# Altium footprint library WR-TBL_Spring Clamp.PcbLib: 258 footprints (part 12 of 17)
Each footprint in its own frame and in the unit in brackets; x right, y up, seen from the top. Pads: shape width x height; smd on the part's side, far side on the other; paste and mask are expansions set on the pad; w line width, h text height; cw(c..) or ccw(c..) is an arc to the next point about the centre after c.
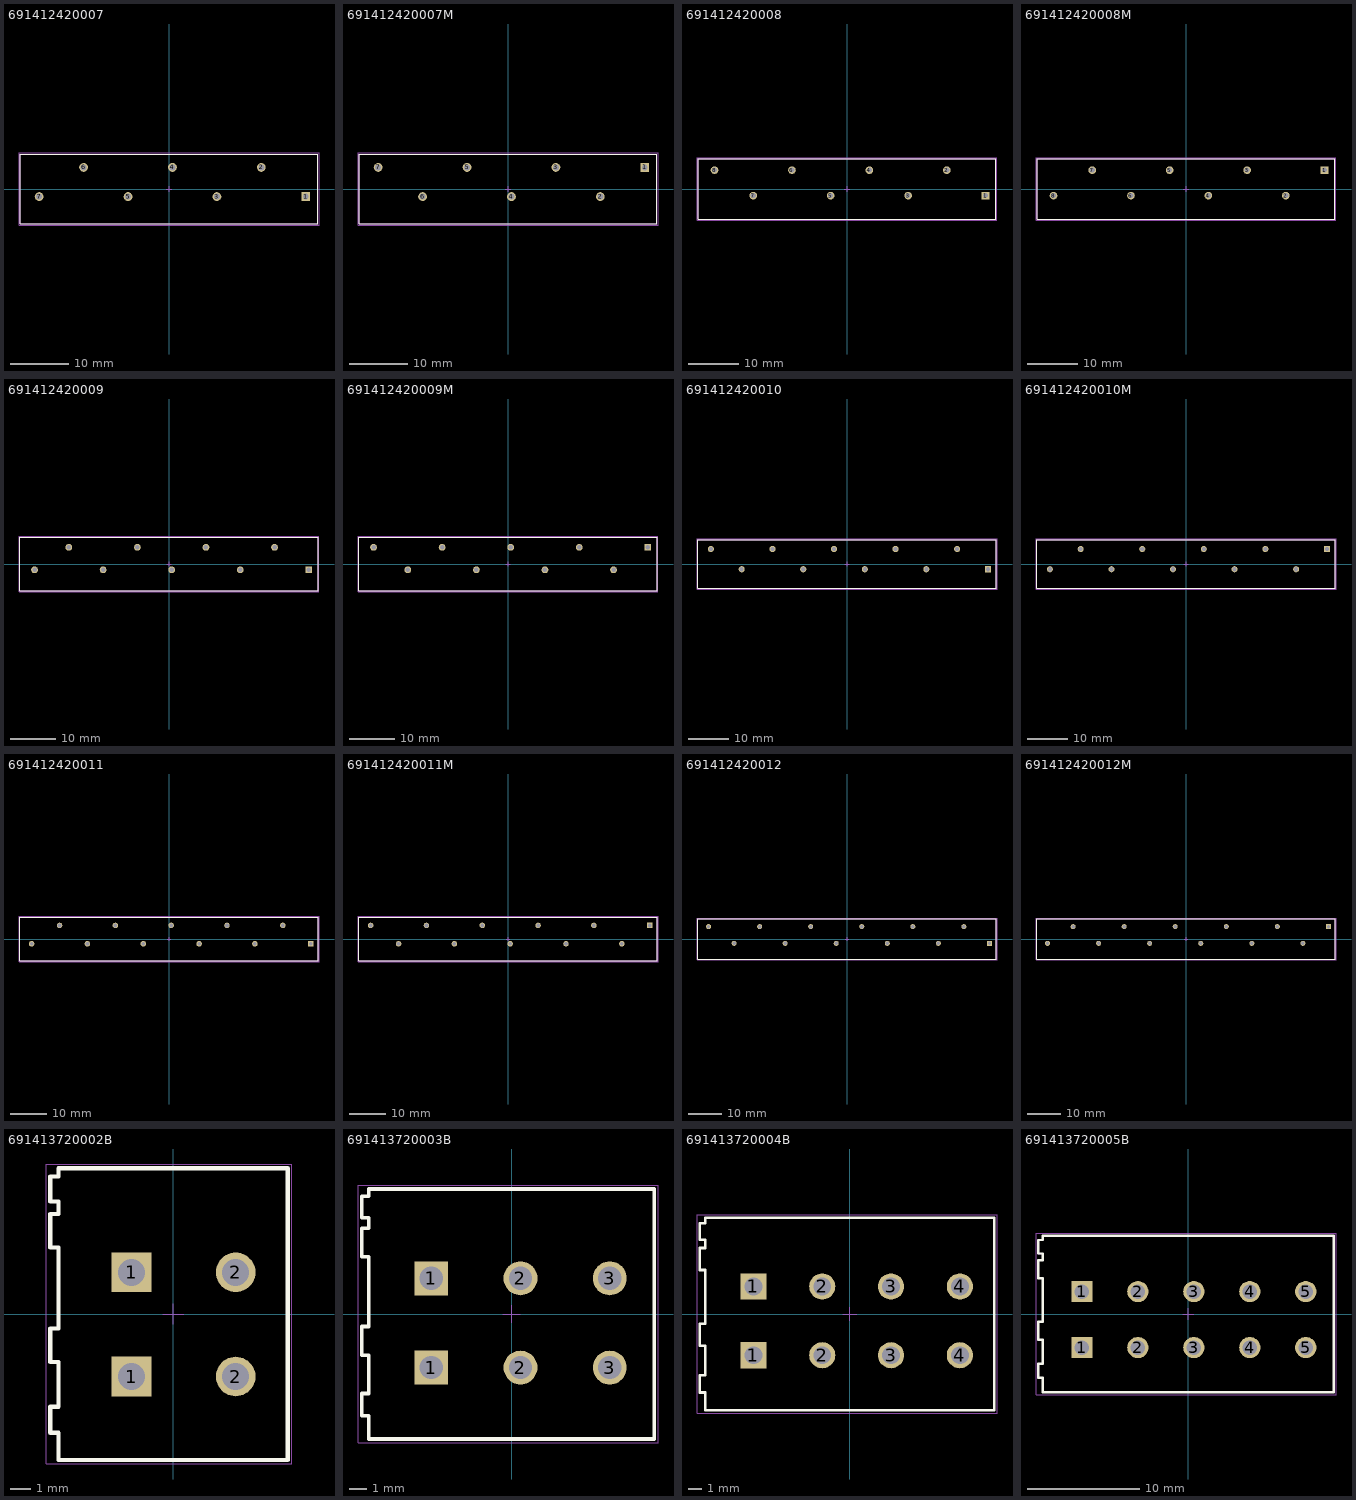
[diagram p11: the footprints below, top view; thin cyan lines are the x and y axes]

## 691412420007 [mm] "7.62mm 45deg Cable Entry Screwless, 7p"
height 13.2
pads (7):
  rect 1.5x1.5 hole 1: 1(23.455,-1.3)
  round 1.5 hole 1: 2(15.835,3.7) 3(8.215,-1.3) 4(0.595,3.7) 5(-7.025,-1.3) 6(-14.645,3.7) 7(-22.265,-1.3)
Top Overlay:
  lines w0.2: -25.515,-6 -25.515,6 25.515,6 25.515,-6 -25.515,-6
Mechanical 13:
  lines w0.1: -25.515,-6 25.515,-6 25.515,6 -25.515,6 -25.515,-6
Mechanical 15:
  lines w0.05: -0.5,0 0.5,0 ; 0,-0.5 0,0.5 ; -25.715,-6.2 -25.715,6.2 25.715,6.2 25.715,-6.2 -25.715,-6.2
3D body "691412420007.stp": height 13.28, standoff -3.52, extent -25.515,-6 25.515,6

## 691412420007M [mm] "7.62 mm Screwless 45deg Entry, 7p"
height 13.2
pads (7):
  rect 1.5x1.5 hole 1: 1(23.455,3.7)
  round 1.5 hole 1: 2(15.835,-1.3) 3(8.215,3.7) 4(0.595,-1.3) 5(-7.025,3.7) 6(-14.645,-1.3) 7(-22.265,3.7)
Top Overlay:
  lines w0.2: -25.515,-6 -25.515,6 25.515,6 25.515,-6 -25.515,-6
Mechanical 13:
  lines w0.1: -25.515,-6 25.515,-6 25.515,6 -25.515,6 -25.515,-6
Mechanical 15:
  lines w0.05: -0.5,0 0.5,0 ; 0,-0.5 0,0.5 ; -25.715,-6.2 -25.715,6.2 25.715,6.2 25.715,-6.2 -25.715,-6.2
3D body "691412420007M.stp": height 13.28, standoff -3.52, extent -25.515,-6 25.515,6

## 691412420008 [mm] "7.62mm 45deg Cable Entry Screwless, 8p"
height 13.2
pads (8):
  rect 1.5x1.5 hole 1: 1(27.265,-1.3)
  round 1.5 hole 1: 2(19.645,3.7) 3(12.025,-1.3) 4(4.405,3.7) 5(-3.215,-1.3) 6(-10.835,3.7) 7(-18.455,-1.3) 8(-26.075,3.7)
Top Overlay:
  lines w0.2: -29.325,-6 -29.325,6 29.325,6 29.325,-6 -29.325,-6
Mechanical 13:
  lines w0.1: -29.325,-6 29.325,-6 29.325,6 -29.325,6 -29.325,-6
Mechanical 15:
  lines w0.05: -0.5,0 0.5,0 ; 0,-0.5 0,0.5 ; -29.525,-6.2 -29.525,6.2 29.525,6.2 29.525,-6.2 -29.525,-6.2
3D body "691412420008.stp": height 13.28, standoff -3.52, extent -29.325,-6 29.325,6

## 691412420008M [mm] "7.62 mm Screwless 45deg Entry, 8p"
height 13.2
pads (8):
  rect 1.5x1.5 hole 1: 1(27.265,3.7)
  round 1.5 hole 1: 2(19.645,-1.3) 3(12.025,3.7) 4(4.405,-1.3) 5(-3.215,3.7) 6(-10.835,-1.3) 7(-18.455,3.7) 8(-26.075,-1.3)
Top Overlay:
  lines w0.2: -29.325,-6 -29.325,6 29.325,6 29.325,-6 -29.325,-6
Mechanical 13:
  lines w0.1: -29.325,-6 29.325,-6 29.325,6 -29.325,6 -29.325,-6
Mechanical 15:
  lines w0.05: -0.5,0 0.5,0 ; 0,-0.5 0,0.5 ; -29.525,-6.2 -29.525,6.2 29.525,6.2 29.525,-6.2 -29.525,-6.2
3D body "691412420008M.stp": height 13.28, standoff -3.52, extent -29.325,-6 29.325,6

## 691412420009 [mm] "7.62mm 45deg Cable Entry Screwless, 9p"
height 13.2
pads (9):
  rect 1.5x1.5 hole 1: 1(31.075,-1.3)
  round 1.5 hole 1: 2(23.455,3.7) 3(15.835,-1.3) 4(8.215,3.7) 5(0.595,-1.3) 6(-7.025,3.7) 7(-14.645,-1.3) 8(-22.265,3.7) 9(-29.885,-1.3)
Top Overlay:
  lines w0.2: -33.135,-6 33.135,-6 33.135,6 -33.135,6 -33.135,-6
Mechanical 13:
  lines w0.1: -33.135,-6 -33.135,6 33.135,6 33.135,-6 -33.135,-6
Mechanical 15:
  lines w0.05: -0.5,0 0.5,0 ; 0,-0.5 0,0.5 ; -33.335,-6.2 33.335,-6.2 33.335,6.2 -33.335,6.2 -33.335,-6.2
3D body "691412420009.stp": height 13.28, standoff -3.52, extent -33.135,-6 33.135,6

## 691412420009M [mm] "7.62 mm Screwless 45deg Entry, 9p"
height 13.2
pads (9):
  rect 1.5x1.5 hole 1: 1(31.075,3.7)
  round 1.5 hole 1: 2(23.455,-1.3) 3(15.835,3.7) 4(8.215,-1.3) 5(0.595,3.7) 6(-7.025,-1.3) 7(-14.645,3.7) 8(-22.265,-1.3) 9(-29.885,3.7)
Top Overlay:
  lines w0.2: -33.135,-6 -33.135,6 33.135,6 33.135,-6 -33.135,-6
Mechanical 13:
  lines w0.1: -33.135,-6 33.135,-6 33.135,6 -33.135,6 -33.135,-6
Mechanical 15:
  lines w0.05: -0.5,0 0.5,0 ; 0,-0.5 0,0.5 ; -33.335,-6.2 -33.335,6.2 33.335,6.2 33.335,-6.2 -33.335,-6.2
3D body "691412420009M.stp": height 13.28, standoff -3.52, extent -33.135,-6 33.135,6

## 691412420010 [mm] "7.62mm 45deg Cable Entry Screwless, 10p"
height 13.2
pads (10):
  rect 1.5x1.5 hole 1: 1(34.885,-1.3)
  round 1.5 hole 1: 2(27.265,3.7) 3(19.645,-1.3) 4(12.025,3.7) 5(4.405,-1.3) 6(-3.215,3.7) 7(-10.835,-1.3) 8(-18.455,3.7) 9(-26.075,-1.3) 10(-33.695,3.7)
Top Overlay:
  lines w0.2: -36.945,-6 36.945,-6 36.945,6 -36.945,6 -36.945,-6
Mechanical 13:
  lines w0.1: -36.945,-6 -36.945,6 36.945,6 36.945,-6 -36.945,-6
Mechanical 15:
  lines w0.05: -0.5,0 0.5,0 ; 0,-0.5 0,0.5 ; -37.145,-6.2 37.145,-6.2 37.145,6.2 -37.145,6.2 -37.145,-6.2
3D body "691412420010.stp": height 13.28, standoff -3.52, extent -36.945,-6 36.945,6

## 691412420010M [mm] "7.62 mm Screwless 45deg Entry, 10p"
height 13.2
pads (10):
  rect 1.5x1.5 hole 1: 1(34.885,3.7)
  round 1.5 hole 1: 2(27.265,-1.3) 3(19.645,3.7) 4(12.025,-1.3) 5(4.405,3.7) 6(-3.215,-1.3) 7(-10.835,3.7) 8(-18.455,-1.3) 9(-26.075,3.7) 10(-33.695,-1.3)
Top Overlay:
  lines w0.2: -36.945,-6 36.945,-6 36.945,6 -36.945,6 -36.945,-6
Mechanical 13:
  lines w0.1: -36.945,-6 -36.945,6 36.945,6 36.945,-6 -36.945,-6
Mechanical 15:
  lines w0.05: -0.5,0 0.5,0 ; 0,-0.5 0,0.5 ; -37.145,-6.2 37.145,-6.2 37.145,6.2 -37.145,6.2 -37.145,-6.2
3D body "691412420010M.stp": height 13.28, standoff -3.52, extent -36.945,-6 36.945,6

## 691412420011 [mm] "7.62mm 45deg Cable Entry Screwless, 11p"
height 13.2
pads (11):
  rect 1.5x1.5 hole 1: 1(38.695,-1.3)
  round 1.5 hole 1: 2(31.075,3.7) 3(23.455,-1.3) 4(15.835,3.7) 5(8.215,-1.3) 6(0.595,3.7) 7(-7.025,-1.3) 8(-14.645,3.7) 9(-22.265,-1.3) 10(-29.885,3.7) 11(-37.505,-1.3)
Top Overlay:
  lines w0.2: -40.755,-6 40.755,-6 40.755,6 -40.755,6 -40.755,-6
Mechanical 13:
  lines w0.1: -40.755,-6 -40.755,6 40.755,6 40.755,-6 -40.755,-6
Mechanical 15:
  lines w0.05: -0.5,0 0.5,0 ; 0,-0.5 0,0.5 ; -40.955,-6.2 40.955,-6.2 40.955,6.2 -40.955,6.2 -40.955,-6.2
3D body "691412420011.stp": height 13.28, standoff -3.52, extent -40.755,-6 40.755,6

## 691412420011M [mm] "7.62 mm Screwless 45deg Entry, 11p"
height 13.2
pads (11):
  rect 1.5x1.5 hole 1: 1(38.695,3.7)
  round 1.5 hole 1: 2(31.075,-1.3) 3(23.455,3.7) 4(15.835,-1.3) 5(8.215,3.7) 6(0.595,-1.3) 7(-7.025,3.7) 8(-14.645,-1.3) 9(-22.265,3.7) 10(-29.885,-1.3) 11(-37.505,3.7)
Top Overlay:
  lines w0.2: -40.755,-6 -40.755,6 40.755,6 40.755,-6 -40.755,-6
Mechanical 13:
  lines w0.1: -40.755,-6 40.755,-6 40.755,6 -40.755,6 -40.755,-6
Mechanical 15:
  lines w0.05: -0.5,0 0.5,0 ; 0,-0.5 0,0.5 ; -40.955,-6.2 -40.955,6.2 40.955,6.2 40.955,-6.2 -40.955,-6.2
3D body "691412420011M.stp": height 13.28, standoff -3.52, extent -40.755,-6 40.755,6

## 691412420012 [mm] "7.62mm 45deg Cable Entry Screwless, 12p"
height 13.2
pads (12):
  rect 1.5x1.5 hole 1: 1(42.505,-1.3)
  round 1.5 hole 1: 2(34.885,3.7) 3(27.265,-1.3) 4(19.645,3.7) 5(12.025,-1.3) 6(4.405,3.7) 7(-3.215,-1.3) 8(-10.835,3.7) 9(-18.455,-1.3) 10(-26.075,3.7) 11(-33.695,-1.3) 12(-41.315,3.7)
Top Overlay:
  lines w0.2: -44.565,-6 -44.565,6 44.565,6 44.565,-6 -44.565,-6
Mechanical 13:
  lines w0.1: -44.565,-6 44.565,-6 44.565,6 -44.565,6 -44.565,-6
Mechanical 15:
  lines w0.05: -0.5,0 0.5,0 ; 0,-0.5 0,0.5 ; -44.765,-6.2 -44.765,6.2 44.765,6.2 44.765,-6.2 -44.765,-6.2
3D body "691412420012.stp": height 13.28, standoff -3.52, extent -44.565,-6 44.565,6

## 691412420012M [mm] "7.62 mm Screwless 45deg Entry, 12p"
height 13.2
pads (12):
  rect 1.5x1.5 hole 1: 1(42.505,3.7)
  round 1.5 hole 1: 2(34.885,-1.3) 3(27.265,3.7) 4(19.645,-1.3) 5(12.025,3.7) 6(4.405,-1.3) 7(-3.215,3.7) 8(-10.835,-1.3) 9(-18.455,3.7) 10(-26.075,-1.3) 11(-33.695,3.7) 12(-41.315,-1.3)
Top Overlay:
  lines w0.2: -44.565,-6 44.565,-6 44.565,6 -44.565,6 -44.565,-6
Mechanical 13:
  lines w0.1: -44.565,-6 -44.565,6 44.565,6 44.565,-6 -44.565,-6
Mechanical 15:
  lines w0.05: -0.5,0 0.5,0 ; 0,-0.5 0,0.5 ; -44.765,-6.2 44.765,-6.2 44.765,6.2 -44.765,6.2 -44.765,-6.2
3D body "691412420012M.stp": height 13.28, standoff -3.52, extent -44.565,-6 44.565,6

## 691413720002B [mm] "5.00 mm Screwless 45° Entry - 3.00 mm2 Wires, 2p"
height 13
pads (4):
  rect 1.9x1.9 hole 1.3: 1(-2,-3) 1(-2,2)
  round 1.9 hole 1.3: 2(3,-3) 2(3,2)
Top Overlay:
  lines w0.2: -5.9,-5.7 -5.9,-4.45 -5.5,-4.45 -5.5,-2.3 -5.9,-2.3 -5.9,-0.7 -5.5,-0.7 -5.5,3.2 -5.9,3.2 -5.9,4.8 -5.5,4.8 -5.5,5.4 -5.9,5.4 -5.9,6.6 -5.5,6.6 -5.5,7 5.5,7 5.5,-7 -5.5,-7 -5.5,-5.7 -5.9,-5.7
Mechanical 13:
  lines w0.1: -5.9,-5.7 -5.5,-5.7 -5.5,-7 5.5,-7 5.5,7 -5.5,7 -5.5,6.6 -5.9,6.6 -5.9,5.4 -5.5,5.4 -5.5,4.8 -5.9,4.8 -5.9,3.2 -5.5,3.2 -5.5,-0.7 -5.9,-0.7 -5.9,-2.3 -5.5,-2.3 -5.5,-4.45 -5.9,-4.45 -5.9,-5.7
Mechanical 15:
  lines w0.05: -0.5,0 0.5,0 ; 0,-0.5 0,0.5 ; -6.1,-7.2 -6.1,7.2 5.7,7.2 5.7,-7.2 -6.1,-7.2
3D body "691413720002B.stp": height 13.08, standoff -3.42, extent -5.9,-7 5.5,7

## 691413720003B [mm] "5.00 mm Screwless 45° Entry - 3.00 mm2 Wires, 3p"
height 13
pads (6):
  rect 1.9x1.9 hole 1.3: 1(-4.5,-3) 1(-4.5,2)
  round 1.9 hole 1.3: 2(0.5,-3) 2(0.5,2) 3(5.5,-3) 3(5.5,2)
Top Overlay:
  lines w0.2: -8.4,-5.7 -8,-5.7 -8,-7 8,-7 8,7 -8,7 -8,6.6 -8.4,6.6 -8.4,5.4 -8,5.4 -8,4.8 -8.4,4.8 -8.4,3.2 -8,3.2 -8,-0.7 -8.4,-0.7 -8.4,-2.3 -8,-2.3 -8,-4.45 -8.4,-4.45 -8.4,-5.7
Mechanical 13:
  lines w0.1: -8.4,-5.7 -8.4,-4.45 -8,-4.45 -8,-2.3 -8.4,-2.3 -8.4,-0.7 -8,-0.7 -8,3.2 -8.4,3.2 -8.4,4.8 -8,4.8 -8,5.4 -8.4,5.4 -8.4,6.6 -8,6.6 -8,7 8,7 8,-7 -8,-7 -8,-5.7 -8.4,-5.7
Mechanical 15:
  lines w0.05: -0.5,0 0.5,0 ; 0,-0.5 0,0.5 ; -8.6,-7.2 8.2,-7.2 8.2,7.2 -8.6,7.2 -8.6,-7.2
3D body "691413720003B.stp": height 13.08, standoff -3.42, extent -8.4,-7 8,7

## 691413720004B [mm] "5.00 mm Screwless 45° Entry - 3.00 mm2 Wires, 4p"
height 13
pads (8):
  rect 1.9x1.9 hole 1.3: 1(-7,-3) 1(-7,2)
  round 1.9 hole 1.3: 2(-2,-3) 2(-2,2) 3(3,-3) 3(3,2) 4(8,-3) 4(8,2)
Top Overlay:
  lines w0.2: -10.9,-5.7 -10.9,-4.45 -10.5,-4.45 -10.5,-2.3 -10.9,-2.3 -10.9,-0.7 -10.5,-0.7 -10.5,3.2 -10.9,3.2 -10.9,4.8 -10.5,4.8 -10.5,5.4 -10.9,5.4 -10.9,6.6 -10.5,6.6 -10.5,7 10.5,7 10.5,-7 -10.5,-7 -10.5,-5.7 -10.9,-5.7
Mechanical 13:
  lines w0.1: -10.9,-5.7 -10.5,-5.7 -10.5,-7 10.5,-7 10.5,7 -10.5,7 -10.5,6.6 -10.9,6.6 -10.9,5.4 -10.5,5.4 -10.5,4.8 -10.9,4.8 -10.9,3.2 -10.5,3.2 -10.5,-0.7 -10.9,-0.7 -10.9,-2.3 -10.5,-2.3 -10.5,-4.45 -10.9,-4.45 -10.9,-5.7
Mechanical 15:
  lines w0.05: -0.5,0 0.5,0 ; 0,-0.5 0,0.5 ; -11.1,-7.2 -11.1,7.2 10.7,7.2 10.7,-7.2 -11.1,-7.2
3D body "691413720004B.stp": height 13.08, standoff -3.42, extent -10.9,-7 10.5,7

## 691413720005B [mm] "5.00 mm Screwless 45° Entry - 3.00 mm2 Wires, 5p"
height 13
pads (10):
  rect 1.9x1.9 hole 1.3: 1(-9.5,-3) 1(-9.5,2)
  round 1.9 hole 1.3: 2(-4.5,-3) 2(-4.5,2) 3(0.5,-3) 3(0.5,2) 4(5.5,-3) 4(5.5,2) 5(10.5,-3) 5(10.5,2)
Top Overlay:
  lines w0.2: -13.4,-5.7 -13,-5.7 -13,-7 13,-7 13,7 -13,7 -13,6.6 -13.4,6.6 -13.4,5.4 -13,5.4 -13,4.8 -13.4,4.8 -13.4,3.2 -13,3.2 -13,-0.7 -13.4,-0.7 -13.4,-2.3 -13,-2.3 -13,-4.45 -13.4,-4.45 -13.4,-5.7
Mechanical 13:
  lines w0.1: -13.4,-5.7 -13.4,-4.45 -13,-4.45 -13,-2.3 -13.4,-2.3 -13.4,-0.7 -13,-0.7 -13,3.2 -13.4,3.2 -13.4,4.8 -13,4.8 -13,5.4 -13.4,5.4 -13.4,6.6 -13,6.6 -13,7 13,7 13,-7 -13,-7 -13,-5.7 -13.4,-5.7
Mechanical 15:
  lines w0.05: -0.5,0 0.5,0 ; 0,-0.5 0,0.5 ; -13.6,-7.2 13.2,-7.2 13.2,7.2 -13.6,7.2 -13.6,-7.2
3D body "691413720005B.stp": height 13.08, standoff -3.42, extent -13.4,-7 13,7